# Altium footprint library bethu.PcbLib: 628 footprints (part 17 of 40)
Each footprint in its own frame and in the unit in brackets; x right, y up, seen from the top. Pads: shape width x height; smd on the part's side, far side on the other; paste and mask are expansions set on the pad; w line width, h text height; cw(c..) or ccw(c..) is an arc to the next point about the centre after c.
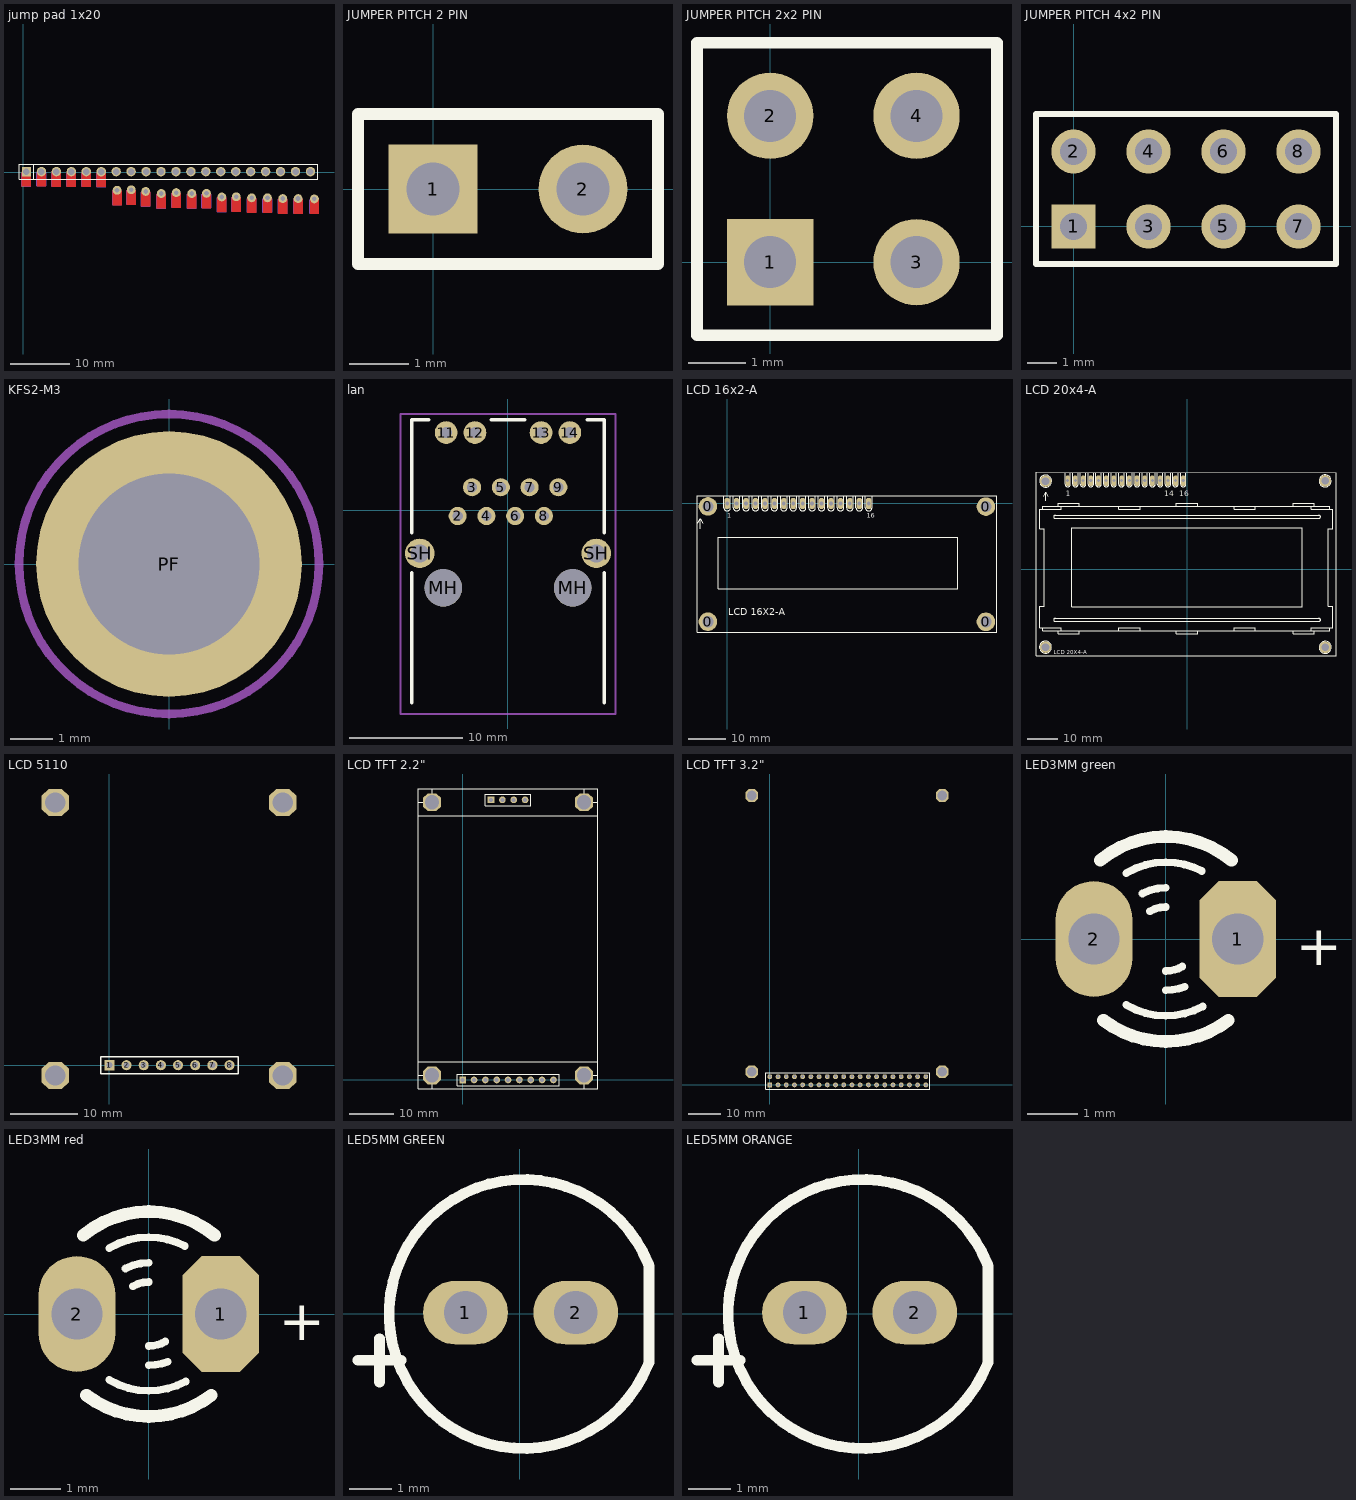
[diagram p16: the footprints below, top view; thin cyan lines are the x and y axes]

## jump pad 1x20 [mm]
pads (40):
  round 1.5 hole 0.8: ""(0.54,0.117) ""(3.118,0.142) ""(5.62,0.091) ""(8.185,0.066) ""(10.725,0.066) ""(13.265,0.04) ""(15.958,-3.058) ""(18.371,-2.982) ""(20.809,-3.262) ""(23.476,-3.617) ""(26.016,-3.465) ""(28.658,-3.617) ""(31.147,-3.592) ""(33.763,-4.201) ""(36.201,-4.176) ""(38.818,-4.354) ""(41.51,-4.354) ""(44.101,-4.481) ""(46.717,-4.481) ""(49.486,-4.532)
  rect 1.6x1.6 hole 1.1: ""(0.559,0.102)
  round 1.6 hole 1.1: ""(3.099,0.102) ""(5.639,0.102) ""(8.179,0.102) ""(10.719,0.102) ""(13.259,0.102) ""(15.799,0.102) ""(18.339,0.102) ""(20.879,0.102) ""(23.419,0.102) ""(25.959,0.102) ""(28.499,0.102) ""(31.039,0.102) ""(33.579,0.102) ""(36.119,0.102) ""(38.659,0.102) ""(41.199,0.102) ""(43.739,0.102) ""(46.279,0.102) ""(48.819,0.102)
Top Layer:
  region: 15.215,-3.111 15.215,-5.601 16.694,-5.601 16.697,-5.601 16.701,-5.601 16.706,-5.6 16.711,-5.599 16.713,-5.598 16.713,-3.111
  region: 9.982,0.013 9.982,-2.477 11.462,-2.477 11.464,-2.477 11.469,-2.477 11.474,-2.476 11.478,-2.475 11.481,-2.474 11.481,0.013
  region: 12.522,-0.012 12.522,-2.502 14.002,-2.502 14.004,-2.502 14.009,-2.502 14.014,-2.501 14.018,-2.5 14.021,-2.499 14.021,-0.012
  region: 17.628,-3.035 17.628,-5.525 19.107,-5.525 19.11,-5.525 19.114,-5.525 19.119,-5.524 19.124,-5.523 19.126,-5.522 19.126,-3.035
  region: 20.066,-3.314 20.066,-5.804 21.546,-5.804 21.548,-5.804 21.553,-5.804 21.558,-5.803 21.562,-5.802 21.565,-5.801 21.565,-3.314
  region: 25.273,-3.518 25.273,-6.007 26.753,-6.007 26.755,-6.007 26.76,-6.007 26.765,-6.006 26.769,-6.005 26.772,-6.005 26.772,-3.518
  region: 30.404,-3.645 30.404,-6.134 31.883,-6.134 31.886,-6.134 31.891,-6.134 31.895,-6.133 31.9,-6.132 31.902,-6.132 31.902,-3.645
  region: 27.915,-3.67 27.915,-6.16 29.394,-6.16 29.397,-6.16 29.401,-6.16 29.406,-6.159 29.411,-6.158 29.413,-6.157 29.413,-3.67
  region: 22.733,-3.67 22.733,-6.16 24.213,-6.16 24.215,-6.16 24.22,-6.16 24.225,-6.159 24.229,-6.158 24.232,-6.157 24.232,-3.67
  region: 35.458,-4.229 35.458,-6.719 36.938,-6.719 36.94,-6.719 36.945,-6.718 36.95,-6.718 36.955,-6.717 36.957,-6.716 36.957,-4.229
  region: 33.02,-4.254 33.02,-6.744 34.5,-6.744 34.502,-6.744 34.507,-6.744 34.512,-6.743 34.516,-6.742 34.519,-6.741 34.519,-4.254
  region: 40.767,-4.407 40.767,-6.896 42.247,-6.896 42.249,-6.896 42.254,-6.896 42.259,-6.895 42.263,-6.894 42.266,-6.894 42.266,-4.407
  region: 38.075,-4.407 38.075,-6.896 39.554,-6.896 39.557,-6.896 39.561,-6.896 39.566,-6.895 39.571,-6.894 39.573,-6.894 39.573,-4.407
  region: 45.974,-4.534 45.974,-7.023 47.454,-7.023 47.456,-7.023 47.461,-7.023 47.466,-7.022 47.47,-7.021 47.473,-7.021 47.473,-4.534
  region: 43.358,-4.534 43.358,-7.023 44.837,-7.023 44.84,-7.023 44.845,-7.023 44.849,-7.022 44.854,-7.021 44.856,-7.021 44.856,-4.534
  region: 48.743,-4.584 48.743,-7.074 50.222,-7.074 50.225,-7.074 50.229,-7.074 50.234,-7.073 50.239,-7.072 50.241,-7.071 50.241,-4.584
  region: -0.203,0.064 -0.203,-2.426 1.276,-2.426 1.279,-2.426 1.284,-2.426 1.288,-2.425 1.293,-2.424 1.295,-2.423 1.295,0.064
  region: 2.375,0.089 2.375,-2.401 3.854,-2.401 3.857,-2.401 3.862,-2.4 3.866,-2.4 3.871,-2.399 3.873,-2.398 3.873,0.089
  region: 4.877,0.038 4.877,-2.451 6.356,-2.451 6.359,-2.451 6.364,-2.451 6.368,-2.45 6.373,-2.449 6.375,-2.449 6.375,0.038
  region: 7.442,0.013 7.442,-2.477 8.922,-2.477 8.924,-2.477 8.929,-2.477 8.934,-2.476 8.938,-2.475 8.941,-2.474 8.941,0.013
Top Overlay:
  lines w0.2: 1.829,-1.168 1.829,1.372 ; -0.711,-1.168 -0.711,1.372 1.194,1.372 50.089,1.372 50.089,-1.168 -0.711,-1.168
Mechanical 1:
  lines w0.127: 1.276,-2.362 -0.235,-2.362 -0.235,0 ; 1.314,-2.362 1.314,0 ; 3.854,-2.337 2.343,-2.337 2.343,0.025 ; 3.893,-2.337 3.893,0.025 ; 6.356,-2.388 4.845,-2.388 4.845,-0.025 ; 6.394,-2.388 6.394,-0.025 ; 8.922,-2.413 7.41,-2.413 7.41,-0.051 ; 8.96,-2.413 8.96,-0.051 ; 11.462,-2.413 9.95,-2.413 9.95,-0.051 ; 11.5,-2.413 11.5,-0.051 ; 14.002,-2.438 12.49,-2.438 12.49,-0.076 ; 14.04,-2.438 14.04,-0.076 ; 16.694,-5.537 15.183,-5.537 15.183,-3.175 ; 16.732,-5.537 16.732,-3.175 ; 19.107,-5.461 17.596,-5.461 17.596,-3.099 ; 19.145,-5.461 19.145,-3.099 ; 21.546,-5.74 20.034,-5.74 20.034,-3.378 ; 21.584,-5.74 21.584,-3.378 ; 24.213,-6.096 22.701,-6.096 22.701,-3.734 ; 24.251,-6.096 24.251,-3.734 ; 26.753,-5.944 25.241,-5.944 25.241,-3.581 ; 26.791,-5.944 26.791,-3.581 ; 29.394,-6.096 27.883,-6.096 27.883,-3.734 ; 29.432,-6.096 29.432,-3.734 ; 31.883,-6.071 30.372,-6.071 30.372,-3.708 ; 31.921,-6.071 31.921,-3.708 ; 34.5,-6.68 32.988,-6.68 32.988,-4.318 ; 34.538,-6.68 34.538,-4.318 ; 36.938,-6.655 35.427,-6.655 35.427,-4.293 ; 36.976,-6.655 36.976,-4.293 ; 39.554,-6.833 38.043,-6.833 38.043,-4.47 ; 39.592,-6.833 39.592,-4.47 ; 42.247,-6.833 40.735,-6.833 40.735,-4.47 ; 42.285,-6.833 42.285,-4.47 ; 44.837,-6.96 43.326,-6.96 43.326,-4.597 ; 44.875,-6.96 44.875,-4.597 ; 47.454,-6.96 45.942,-6.96 45.942,-4.597 ; 47.492,-6.96 47.492,-4.597 ; 50.222,-7.01 48.711,-7.01 48.711,-4.648 ; 50.26,-7.01 50.26,-4.648 ; -0.235,0 ccw(c0.54,0.117) 1.314,0 ; -0.235,0 0.489,0 1.314,0 ; 2.343,0.025 ccw(c3.118,0.142) 3.893,0.025 ; 2.343,0.025 3.067,0.025 3.893,0.025 ; 4.845,-0.025 ccw(c5.62,0.091) 6.394,-0.025 ; 4.845,-0.025 5.569,-0.025 6.394,-0.025 ; 7.41,-0.051 ccw(c8.185,0.066) 8.96,-0.051 ; 7.41,-0.051 8.134,-0.051 8.96,-0.051 ; 9.95,-0.051 ccw(c10.725,0.066) 11.5,-0.051 ; 9.95,-0.051 10.674,-0.051 11.5,-0.051 ; 12.49,-0.076 ccw(c13.265,0.04) 14.04,-0.076 ; 12.49,-0.076 13.214,-0.076 14.04,-0.076 ; 15.183,-3.175 ccw(c15.958,-3.058) 16.732,-3.175 ; 15.183,-3.175 15.907,-3.175 16.732,-3.175 ; 17.596,-3.099 ccw(c18.371,-2.982) 19.145,-3.099 ; 17.596,-3.099 18.32,-3.099 19.145,-3.099 ; 20.034,-3.378 ccw(c20.809,-3.262) 21.584,-3.378 ; 20.034,-3.378 20.758,-3.378 21.584,-3.378 ; 22.701,-3.734 ccw(c23.476,-3.617) 24.251,-3.734 ; 22.701,-3.734 23.425,-3.734 24.251,-3.734 ; 25.241,-3.581 ccw(c26.016,-3.465) 26.791,-3.581 ; 25.241,-3.581 25.965,-3.581 26.791,-3.581 ; 27.883,-3.734 ccw(c28.658,-3.617) 29.432,-3.734 ; 27.883,-3.734 28.607,-3.734 29.432,-3.734 ; 30.372,-3.708 ccw(c31.147,-3.592) 31.921,-3.708 ; 30.372,-3.708 31.096,-3.708 31.921,-3.708 ; 32.988,-4.318 ccw(c33.763,-4.201) 34.538,-4.318 ; 32.988,-4.318 33.712,-4.318 34.538,-4.318 ; 35.427,-4.293 ccw(c36.201,-4.176) 36.976,-4.293 ; 35.427,-4.293 36.151,-4.293 36.976,-4.293 ; 38.043,-4.47 ccw(c38.818,-4.354) 39.592,-4.47 ; 38.043,-4.47 38.767,-4.47 39.592,-4.47 ; 40.735,-4.47 ccw(c41.51,-4.354) 42.285,-4.47 ; 40.735,-4.47 41.459,-4.47 42.285,-4.47 ; 43.326,-4.597 ccw(c44.101,-4.481) 44.875,-4.597 ; 43.326,-4.597 44.05,-4.597 44.875,-4.597 ; 45.942,-4.597 ccw(c46.717,-4.481) 47.492,-4.597 ; 45.942,-4.597 46.666,-4.597 47.492,-4.597 ; 48.711,-4.648 ccw(c49.486,-4.532) 50.26,-4.648 ; 48.711,-4.648 49.435,-4.648 50.26,-4.648

## JUMPER PITCH 2 PIN [mm] "Connector; Header; 2 Position"
pads (2):
  rect 1.5x1.5 hole 0.9: 1(0,0)
  round 1.5 hole 0.9: 2(2.54,0)
Top Overlay:
  lines w0.2: -1.27,-1.27 -1.27,1.27 3.81,1.27 3.81,-1.27 -1.27,-1.27
3D body "User Library-jumper 2_54mm.STEP": height 7.6, standoff 1.6, extent -1.23,-1.073 3.77,1.327
3D body: height 1.5, standoff 0, extent 1.27,-1.27 3.81,1.27
3D body: height 7, standoff -1, extent 2.134,-0.406 2.93,0.392
3D body: height 7, standoff -1, extent -0.406,-0.406 0.39,0.392
3D body: height 1.5, standoff 0, extent -1.27,-1.27 1.27,1.27

## JUMPER PITCH 2x2 PIN [mm] "Connector; Header; 2x2 Position"
pads (4):
  rect 1.5x1.5 hole 0.9: 1(0,0)
  round 1.5 hole 0.9: 2(0,2.54) 3(2.54,0) 4(2.54,2.54)
Top Overlay:
  lines w0.2: -1.27,-1.27 -1.27,3.81 3.937,3.81 3.937,-1.27 -1.27,-1.27
3D body "User Library-jumper 2_54mm.STEP": height 7.6, standoff 1.6, extent 1.467,-1.23 3.867,3.77
3D body "User Library-jumper 2_54mm.STEP": height 7.6, standoff 1.6, extent -1.13,-1.23 1.27,3.77
3D body: height 1.5, standoff 0, extent -1.27,1.27 1.27,3.81
3D body: height 1.5, standoff 0, extent 1.27,1.27 3.81,3.81
3D body: height 1.5, standoff 0, extent 1.27,-1.27 3.81,1.27
3D body: height 1.5, standoff 0, extent -1.27,-1.27 1.27,1.27
3D body: height 7, standoff -1, extent -0.392,2.134 0.406,2.93
3D body: height 7, standoff -1, extent -0.392,-0.406 0.406,0.39
3D body: height 7, standoff -1, extent 2.148,2.134 2.946,2.93
3D body: height 7, standoff -1, extent 2.148,-0.406 2.946,0.39

## JUMPER PITCH 4x2 PIN [mm] "Connector; Header; 4x2 Position"
pads (8):
  rect 1.5x1.5 hole 0.9: 1(0,0)
  round 1.5 hole 0.9: 2(0,2.54) 3(2.54,0) 4(2.54,2.54) 5(5.08,0) 6(5.08,2.54) 7(7.62,0) 8(7.62,2.54)
Top Overlay:
  lines w0.2: -1.27,-1.27 -1.27,3.81 8.89,3.81 8.89,-1.27 -1.27,-1.27
3D body "User Library-jumper 2_54mm.STEP": height 7.6, standoff 1.6, extent 6.547,-1.23 8.947,3.77
3D body "User Library-jumper 2_54mm.STEP": height 7.6, standoff 1.6, extent 4.007,-1.23 6.407,3.77
3D body "User Library-jumper 2_54mm.STEP": height 7.6, standoff 1.6, extent 1.467,-1.23 3.867,3.77
3D body "User Library-jumper 2_54mm.STEP": height 7.6, standoff 1.6, extent -1.13,-1.23 1.27,3.77
3D body: height 1.5, standoff 0, extent -1.27,1.27 1.27,3.81
3D body: height 1.5, standoff 0, extent 1.27,1.27 3.81,3.81
3D body: height 1.5, standoff 0, extent 3.81,1.27 6.35,3.81
3D body: height 1.5, standoff 0, extent 6.35,1.27 8.89,3.81
3D body: height 1.5, standoff 0, extent 6.35,-1.27 8.89,1.27
3D body: height 1.5, standoff 0, extent 3.81,-1.27 6.35,1.27
3D body: height 1.5, standoff 0, extent 1.27,-1.27 3.81,1.27
3D body: height 1.5, standoff 0, extent -1.27,-1.27 1.27,1.27
3D body: height 7, standoff -1, extent -0.392,2.134 0.406,2.93
3D body: height 7, standoff -1, extent -0.392,-0.406 0.406,0.39
3D body: height 7, standoff -1, extent 2.148,2.134 2.946,2.93
3D body: height 7, standoff -1, extent 2.148,-0.406 2.946,0.39
3D body: height 7, standoff -1, extent 4.688,2.134 5.486,2.93
3D body: height 7, standoff -1, extent 4.688,-0.406 5.486,0.39
3D body: height 7, standoff -1, extent 7.228,2.134 8.026,2.93
3D body: height 7, standoff -1, extent 7.228,-0.406 8.026,0.39

## KFS2-M3 [mm]
pads (1):
  round 6.2 hole 4.22: PF(0,0)
Mechanical 13:
  lines w0.2: -3.5,0 cw(c0,0) 0,3.5 cw(c0,0) 3.5,0 cw(c0,0) 0,-3.5 cw(c0,0) -3.5,0
  text "PRESS-FIT" at -2.274,1.1 h0.5
  text "'.Designator'" at -5.815,-0.9 h1
3D body "KFS2-M3.stp": height 1.51, standoff -1.52, extent -2.78,-2.78 2.781,2.78

## lan [mm]
pads (16):
  round 1.6 hole 0.9: 2(-4.445,-0.51) 3(-3.175,2.03) 4(-1.905,-0.51) 5(-0.635,2.03) 6(0.635,-0.51) 7(1.905,2.03) 8(3.175,-0.51) 9(4.445,2.03)
  round 2 hole 1: 11(-5.46,6.86) 12(-2.92,6.86) 13(2.92,6.86) 14(5.46,6.86)
  round 3.3 hole 3.3 unplated: MH(-5.715,-6.86) MH(5.715,-6.86)
  round 2.6 hole 1.6: SH(-7.795,-3.81) SH(7.795,-3.81)
Top Overlay:
  lines w0.3: -8.5,-17 -8.5,-5.5 ; -8.5,-2 -8.5,8 -7,8 ; -1.5,8 1.5,8 ; 7,8 8.5,8 8.5,-2 ; 8.5,-17 8.5,-5.5
Mechanical 13:
  lines w0.2: -9.5,-18 -9.5,8.5 9.5,8.5 9.5,-18 -8,-18 -9.5,-18
  text ".Designator" at -4.998,-0.333 h1
3D body "93463-5206.stp": height 14.11, standoff -3.29, extent -8.12,-17.687 8.12,7.713

## LCD 16x2-A [mil] "Pantalla LCD 16 caracteres x 2 Lineas, conexion superior"
pads (20):
  round 196.85 hole 118.11: 0(-203.74,-1252.95) 0(-203.74,-31.5) 0(2742.13,-33.46) 0(2742.13,-1253.94)
  oct 60x120 hole 40: 1(0,0)
  oval 60x120 hole 40: 2(100,0) 3(200,0) 4(300,0) 5(400,0) 6(500,0) 7(600,0) 8(700,0) 9(800,0) 10(900,0) 11(1000,0) 12(1100,0) 13(1200,0) 14(1300,0) 15(1400,0) 16(1500,0)
Top Overlay:
  lines w5: -319.88,81.67 2859.25,81.67 2859.25,-1365.16 -319.88,-1365.16 -319.88,81.69 ; -310,-210 -285,-160 -260,-210 ; -285,-270.7 -285,-165 ; -35,81.69 -35,-45 ccw(c0,-45) 35,-45 35,80.71 ; 65,79.72 65,-45 ccw(c100,-45) 135,-45 135,80.71 ; 165,80.71 165,-45 ccw(c200,-45) 235,-45 235,80.71 ; 265,80.71 265,-45 ccw(c300,-45) 335,-45 335,80.71 ; 365,81.69 365,-45 ccw(c400,-45) 435,-45 435,81.69 ; 465,81.69 465,-45 ccw(c500,-45) 535,-45 535,79.72 ; 565,80.71 565,-45 ccw(c600,-45) 635,-45 635,81.69 ; 665,81.69 665,-45 ccw(c700,-45) 735,-45 735,81.5 ; 765,80.71 765,-45 ccw(c800,-45) 835,-45 835,80.71 ; 865,80.71 865,-45 ccw(c900,-45) 935,-45 935,80.71 ; 965,80.71 965,-45 ccw(c1000,-45) 1035,-45 1035,81.69 ; 1065,80.71 1065,-45 ccw(c1100,-45) 1135,-45 1135,81.69 ; 1165,80.71 1165,-45 ccw(c1200,-45) 1235,-45 1235,80.71 ; 1265,81.5 1265,-45 ccw(c1300,-45) 1335,-45 1335,79.72 ; 1365,79.72 1365,-45 ccw(c1400,-45) 1435,-45 1435,79.72 ; 1465,79.72 1465,-45 ccw(c1500,-45) 1535,-45 1535,78.74 ; -94.88,-901.6 2444.49,-901.6 2444.49,-358.3 -94.88,-358.3 -94.88,-901.6
  text "LCD 16X2-A" at 11.81,-1186.02 h75
  text "16" at 1480,-150 h50
  text "1" at 0,-150 h50
3D body "HEADER 2_54 VERTICAL 2X-DEFAULT.STEP": height 435.04, standoff 1.97, extent 1350,-48.43 1550,50
3D body "HEADER 2_54 VERTICAL 2X-DEFAULT.STEP": height 435.04, standoff 1.97, extent 1150,-48.43 1350,50
3D body "HEADER 2_54 VERTICAL 2X-DEFAULT.STEP": height 435.04, standoff 1.97, extent 950,-48.43 1150,50
3D body "HEADER 2_54 VERTICAL 2X-DEFAULT.STEP": height 435.04, standoff 1.97, extent 750,-48.43 950,50
3D body "HEADER 2_54 VERTICAL 2X-DEFAULT.STEP": height 435.04, standoff 1.97, extent 550,-48.43 750,50
3D body "HEADER 2_54 VERTICAL 2X-DEFAULT.STEP": height 435.04, standoff 1.97, extent 350,-48.43 550,50
3D body "HEADER 2_54 VERTICAL 2X-DEFAULT.STEP": height 435.04, standoff 1.97, extent 150,-48.43 350,50
3D body "HEADER 2_54 VERTICAL 2X-DEFAULT.STEP": height 435.04, standoff 1.97, extent -50,-48.43 150,50
3D body "User Library-RM254_4pin.STEP": height 237.01, standoff -122.05, extent 1150,-50 1550,50
3D body "User Library-RM254_4pin.STEP": height 237.01, standoff -122.05, extent 750,-50 1150,50
3D body "User Library-RM254_4pin.STEP": height 237.01, standoff -122.05, extent 350,-50 750,50
3D body "User Library-RM254_4pin.STEP": height 237.01, standoff -122.05, extent -50.2,-50.98 349.8,49.02
3D body "LCD module 16 X 2 backlight.STEP": height 761.58, standoff 241.58, extent -315,-1357 2854.29,80

## LCD 20x4-A [mil] "Pantalla LCD de 20 caracteres por 4 Lineas, conector superior"
pads (20):
  oct 60x140 hole 40: 1(-1550.5,1150) 2(-1450.5,1150) 3(-1350.5,1150) 4(-1250.5,1150) 5(-1150.5,1150) 6(-1050.5,1150) 7(-950.5,1150) 8(-850.5,1150) 9(-750.5,1150) 10(-650.5,1150) 11(-550.5,1150) 12(-450.5,1150) 13(-350.5,1150) 14(-250.5,1150) 15(-150.5,1150) 16(-50.5,1150)
  round 150 hole 100: P$1(-1838.48,-1010.39) P$2(1791.77,-1013.35) P$3(1790.78,1147.23) P$4(-1837.5,1143.78)
Top Overlay:
  drawing of 163 lines, arcs and shapes, not listed
  text "LCD 20X4-A" at -1730.52,-1101.37 h50
  text "14" at -300,950 h70
  text "16" at -100,950 h70
  text "1" at -1575,950 h70
3D body "Lcd 4x20.STEP": height 444.88, standoff 157.48, extent -1960.63,-1117.13 1929.13,1252.95
3D body "HEADER 2_54 VERTICAL 2X-DEFAULT.STEP": height 364.17, standoff -68.9, extent -1600,1105.32 -1400,1203.74
3D body "HEADER 2_54 VERTICAL 2X-DEFAULT.STEP": height 364.17, standoff -68.9, extent -1400,1105.32 -1200,1203.74
3D body "HEADER 2_54 VERTICAL 2X-DEFAULT.STEP": height 364.17, standoff -68.9, extent -1200,1105.32 -1000,1203.74
3D body "HEADER 2_54 VERTICAL 2X-DEFAULT.STEP": height 364.17, standoff -68.9, extent -1000,1105.32 -800,1203.74
3D body "HEADER 2_54 VERTICAL 2X-DEFAULT.STEP": height 364.17, standoff -68.9, extent -800,1105.32 -600,1203.74
3D body "HEADER 2_54 VERTICAL 2X-DEFAULT.STEP": height 364.17, standoff -68.9, extent -600,1105.32 -400,1203.74
3D body "HEADER 2_54 VERTICAL 2X-DEFAULT.STEP": height 364.17, standoff -68.9, extent -400,1105.32 -200,1203.74
3D body "HEADER 2_54 VERTICAL 2X-DEFAULT.STEP": height 364.17, standoff -68.9, extent -200,1105.32 0,1203.74

## LCD 5110 [mm]
pads (12):
  rect 1.5x1.5 hole 0.9: 1(0,0)
  round 1.5 hole 0.9: 2(2.54,0) 3(5.08,0) 4(7.62,0) 5(10.16,0) 6(12.7,0) 7(15.24,0) 8(17.78,0)
  oct 4x4 hole 3: ""(-8.001,-1.524) ""(-8.001,38.862) ""(25.654,-1.524) ""(25.654,38.862)
Top Overlay:
  lines w0.2: -1.27,-1.27 -1.27,1.27 19.05,1.27 19.05,-1.27 -1.27,-1.27
3D body "User Library-RM254_4pin.STEP": height 6.02, standoff -3.1, extent 8.89,-1.27 19.05,1.27
3D body "User Library-RM254_4pin.STEP": height 6.02, standoff -3.1, extent -1.27,-1.27 8.89,1.27
3D body "LCD ??????? Nokia 5110.STEP": height 14, standoff -0.3, extent -12.46,-3.998 30.24,41.402

## LCD HDMI 7INCH - duplicate [mm]
3D body "Standoff_M3_14mm.step": height 21, standoff 1, extent 175.014,102.425 180.442,107.125
3D body "Standoff_M3_14mm.step": height 21, standoff 1, extent 0.589,102.273 6.016,106.973
3D body "Standoff_M3_14mm.step": height 21, standoff 1, extent 0.512,0.952 5.94,5.652
3D body "NX8048T070.stp": height 24.1, standoff 8.8, extent 0,0 181,108
3D body "Standoff_M3_14mm.step": height 21, standoff 1, extent 174.985,0.901 180.412,5.601

## LCD TFT 2.2" [mm]
pads (17):
  rect 1.5x1.5 hole 0.9: 1(0,0) 10(6.35,62.738)
  round 1.5 hole 0.9: 2(2.54,0) 3(5.08,0) 4(7.62,0) 5(10.16,0) 6(12.7,0) 7(15.24,0) 8(17.78,0) 9(20.32,0) 11(8.89,62.738) 12(11.43,62.738) 13(13.97,62.738)
  oct 4x4 hole 3.2: ""(-6.858,1.016) ""(-6.858,62.216) ""(27.178,1.016) ""(27.178,62.216)
Top Overlay:
  lines w0.2: -1.27,-1.27 -1.27,1.27 21.59,1.27 21.59,-1.27 -1.27,-1.27 ; 5.08,61.468 15.24,61.468 15.24,64.008 5.08,64.008 5.08,61.468
  lines w0.254: -9.906,4.064 30.194,4.064 ; -9.906,59.182 30.194,59.182 ; -9.892,62.216 -6.858,62.216 -6.858,65.151 ; -9.858,1.016 -6.858,1.016 -6.858,-1.984 ; 27.178,-1.984 27.178,1.016 30.178,1.016 ; 27.178,65.168 27.178,62.216 30.18,62.216 ; -9.906,-2.032 -9.906,65.168 30.194,65.168 30.194,-2.032 -9.906,-2.032
3D body "User Library-RM254_4pin.STEP": height 6.02, standoff -3.1, extent 5.08,61.468 15.24,64.008
3D body "User Library-RM254_4pin.STEP": height 6.02, standoff -3.1, extent 3.81,-1.27 13.97,1.27
3D body "User Library-RM254_4pin.STEP": height 6.02, standoff -3.1, extent -1.27,-1.27 8.89,1.27
3D body "User Library-RM254_4pin.STEP": height 6.02, standoff -3.1, extent 11.43,-1.27 21.59,1.27
3D body "lcd.STEP": height 12, standoff 0, extent -9.89,-2.032 30.21,65.168

## LCD TFT 3.2" [mm]
pads (44):
  rect 1.5x1.5 hole 0.9: 1(0,0)
  round 1.5 hole 0.9: 2(2.54,0) 3(5.08,0) 4(7.62,0) 5(10.16,0) 6(12.7,0) 7(15.24,0) 8(17.78,0) 9(20.32,0) 10(22.86,0) 11(25.4,0) 12(27.94,0) 13(30.48,0) 14(33.02,0) 15(35.56,0) 16(38.1,0) 17(40.64,0) 18(43.18,0) 19(45.72,0) 20(48.26,0) 21(0,2.54) 22(2.54,2.54) 23(5.08,2.54) 24(7.62,2.54) 25(10.16,2.54) 26(12.7,2.54) 27(15.24,2.54) 28(17.78,2.54) 29(20.32,2.54) 30(22.86,2.54) 31(25.4,2.54) 32(27.94,2.54) 33(30.48,2.54) 34(33.02,2.54) 35(35.56,2.54) 36(38.1,2.54) 37(40.64,2.54) 38(43.18,2.54) 39(45.72,2.54) 40(48.26,2.54)
  oct 4x4 hole 3: ""(-5.588,4.064) ""(-5.588,89.535) ""(53.34,4.064) ""(53.34,89.535)
Top Overlay:
  lines w0.2: -1.27,-1.27 -1.27,3.81 49.53,3.81 49.53,-1.27 -1.27,-1.27
3D body "User Library-RM254_4pin.STEP": height 6.02, standoff -3.1, extent 29.21,-1.27 39.37,1.27
3D body "User Library-RM254_4pin.STEP": height 6.02, standoff -3.1, extent 29.21,1.27 39.37,3.81
3D body "User Library-RM254_4pin.STEP": height 6.02, standoff -3.1, extent 19.05,-1.27 29.21,1.27
3D body "User Library-RM254_4pin.STEP": height 6.02, standoff -3.1, extent 19.05,1.27 29.21,3.81
3D body "User Library-RM254_4pin.STEP": height 6.02, standoff -3.1, extent -1.27,-1.27 8.89,1.27
3D body "User Library-RM254_4pin.STEP": height 6.02, standoff -3.1, extent -1.27,1.27 8.89,3.81
3D body "User Library-RM254_4pin.STEP": height 6.02, standoff -3.1, extent 8.89,1.27 19.05,3.81
3D body "User Library-RM254_4pin.STEP": height 6.02, standoff -3.1, extent 8.89,-1.27 19.05,1.27
3D body "User Library-RM254_4pin.STEP": height 6.02, standoff -3.1, extent 39.37,1.27 49.53,3.81
3D body "User Library-RM254_4pin.STEP": height 6.02, standoff -3.1, extent 39.37,-1.27 49.53,1.27
3D body "User Library-TFT 3_2 with touch screen.STEP": height 14.35, standoff -0.09, extent -8.12,-1.915 55.88,92.085

## LED3MM green [mm] "Led de 3mm Verde"
pads (2):
  oct 1.524x2.3 hole 1.016: 1(1.425,0)
  oval 1.524x2.3 hole 1.016: 2(-1.425,0)
Top Overlay:
  lines w0.152: -0.784,-1.307 ccw(c0,0) 0,-1.524 ccw(c0,0) 0.73,-1.338 ; -0.784,1.307 cw(c0,0) 0,1.524 cw(c0,0) 0.712,1.348 ; -0.464,0.904 cw(c0,0) 0,1.016 ; -0.312,0.553 cw(c0,0) 0,0.635 ; 0,-1.016 ccw(c0,0) 0.374,-0.945 ; 0,-0.635 ccw(c0,0) 0.327,-0.545
  lines w0.254: -1.301,1.561 cw(c0,0) 0,2.032 cw(c0,0) 1.301,1.561 ; -1.239,-1.611 ccw(c0,0) 0,-2.032 ccw(c0,0) 1.239,-1.611
  text "+" at 2.575,-0.525 h0.8
3D body "LED verde 3mm.STEP": height 5.51, standoff -2.49, extent -1.65,-1.575 1.65,1.714

## LED3MM red [mm] "Led de 3mm rojo"
pads (2):
  oct 1.524x2.3 hole 1.016: 1(1.425,0)
  oval 1.524x2.3 hole 1.016: 2(-1.425,0)
Top Overlay:
  lines w0.152: -0.784,-1.307 ccw(c0,0) 0,-1.524 ccw(c0,0) 0.73,-1.338 ; -0.784,1.307 cw(c0,0) 0,1.524 cw(c0,0) 0.712,1.348 ; -0.464,0.904 cw(c0,0) 0,1.016 ; -0.312,0.553 cw(c0,0) 0,0.635 ; 0,-1.016 ccw(c0,0) 0.374,-0.945 ; 0,-0.635 ccw(c0,0) 0.327,-0.545
  lines w0.254: -1.301,1.561 cw(c0,0) 0,2.032 cw(c0,0) 1.301,1.561 ; -1.239,-1.611 ccw(c0,0) 0,-2.032 ccw(c0,0) 1.239,-1.611
  text "+" at 2.575,-0.525 h0.8
3D body "SW3dPS-LED-1.STEP": height 6, standoff -4, extent -1.675,-1.675 1.825,1.825

## LED5MM GREEN [mm] "Led de 5mm verde"
pads (2):
  oval 2x1.5 hole 1.016: 1(-1.275,0.025) 2(1.325,0.025)
Top Overlay:
  lines w0.254: -3.808,-1.1 -2.792,-1.1 ; -3.3,-1.608 -3.3,-1.1 -3.3,-0.592 ; 3.034,-1.192 cw(c0.094,-0.008) 3.039,1.165 ; 3.05,-1.15 3.05,1.125
3D body "LEDd5G.STEP": height 12.31, standoff -2.49, extent -2.885,-2.875 2.535,3.145

## LED5MM ORANGE [mm] "Led de 5mm naranja"
pads (2):
  oval 2x1.5 hole 1.016: 1(-1.275,0.025) 2(1.325,0.025)
Top Overlay:
  lines w0.254: -3.808,-1.1 -2.792,-1.1 ; -3.3,-1.608 -3.3,-1.1 -3.3,-0.592 ; 3.034,-1.192 cw(c0.094,-0.008) 3.039,1.165 ; 3.05,-1.15 3.05,1.125
3D body "LEDd5O.STEP": height 12.31, standoff -2.49, extent -2.885,-2.875 2.535,3.145